# Altium footprint library PrISUm-ICs.PcbLib: 40 footprints (part 3 of 3)
Each footprint in its own frame and in the unit in brackets; x right, y up, seen from the top. Pads: shape width x height; smd on the part's side, far side on the other; paste and mask are expansions set on the pad; w line width, h text height; cw(c..) or ccw(c..) is an arc to the next point about the centre after c.
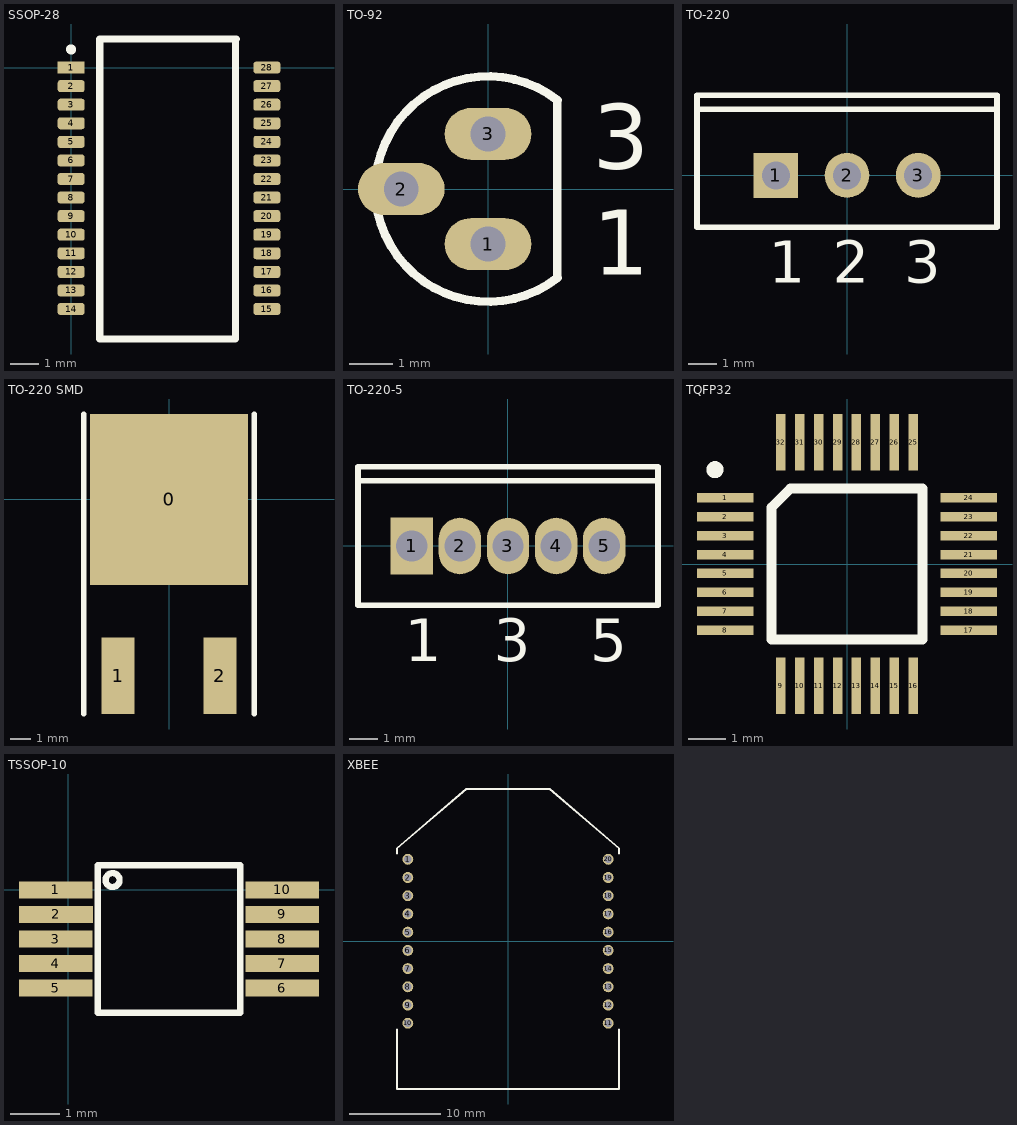
[diagram p2: the footprints below, top view; thin cyan lines are the x and y axes]

## SSOP-28 [mm]
pads (28):
  rect 0.95x0.42 smd: 1(0,0)
  rrect50% 0.95x0.42 smd: 2(0,-0.65) 3(0,-1.3) 4(0,-1.95) 5(0,-2.6) 6(0,-3.25) 7(0,-3.9) 8(0,-4.55) 9(0,-5.2) 10(0,-5.85) 11(0,-6.5) 12(0,-7.15) 13(0,-7.8) 14(0,-8.45) 15(6.85,-8.45) 16(6.85,-7.8) 17(6.85,-7.15) 18(6.85,-6.5) 19(6.85,-5.85) 20(6.85,-5.2) 21(6.85,-4.55) 22(6.85,-3.9) 23(6.85,-3.25) 24(6.85,-2.6) 25(6.85,-1.95) 26(6.85,-1.3) 27(6.85,-0.65) 28(6.85,0)
Top Overlay:
  circle w0.254: c0,0.635 r0.051
  lines w0.254: 5.75,0.975 5.75,0.75 5.75,-9.5 1,-9.5 1,0.75 1,1 5.775,1
3D body "ssop28.stp": height 1.9, standoff 0, extent -0.471,-9.322 7.329,0.878

## TO-92 [mm]
pads (3):
  oval 2x1.2 hole 0.8: 1(0,-1.27) 2(-2,0) 3(0,1.27)
Top Overlay:
  lines w0.2: 1.601,-2.049 cw(c0,0) 1.601,2.049 ; 1.6,-1.99 1.6,1.99
  text "3" at 2.421,0.467 h1.5
  text "1" at 2.421,-1.979 h1.5

## TO-220 [mm]
pads (3):
  rect 1.6x1.6 hole 1: 1(-2.54,0)
  round 1.6 hole 1: 2(0,0) 3(2.54,0)
Top Overlay:
  lines w0.2: -5.35,2.35 5.35,2.35 ; -5.35,-1.85 -5.35,2.85 5.35,2.85 5.35,-1.85 -5.35,-1.85
  text "3" at 2.04,-3.825 h1.5
  text "1" at -2.79,-3.825 h1.5
  text "2" at -0.5,-3.825 h1.5

## TO-220 SMD [mm]
pads (3):
  rect 7.87x8.51 smd: 0(0,0)
  rect 1.65x3.81 smd: 1(-2.54,-8.79) 2(2.54,-8.79)
Top Overlay:
  lines w0.254: -4.25,-10.69 -4.25,4.26 ; 4.25,-10.69 4.25,4.26

## TO-220-5 [mm]
pads (5):
  rect 1.5x2 hole 1.1: 1(-3.4,0)
  oval 1.5x2 hole 1.1: 2(-1.7,0) 3(0,0) 4(1.7,0) 5(3.4,0)
Top Overlay:
  lines w0.2: -5.3,2.3 5.3,2.3 ; -5.3,-2.1 5.3,-2.1 5.3,2.8 -5.3,2.8 -5.3,-2.1
  text "1" at -3.65,-4.075 h1.5
  text "3" at -0.5,-4.075 h1.5
  text "5" at 2.9,-4.075 h1.5

## TQFP32 [mm]
pads (32):
  rect 1.5x0.25 smd: 1(-3.225,1.75) 2(-3.225,1.25) 3(-3.225,0.75) 4(-3.225,0.25) 5(-3.225,-0.25) 6(-3.225,-0.75) 7(-3.225,-1.25) 8(-3.225,-1.75) 17(3.225,-1.75) 18(3.225,-1.25) 19(3.225,-0.75) 20(3.225,-0.25) 21(3.225,0.25) 22(3.225,0.75) 23(3.225,1.25) 24(3.225,1.75)
  rect 0.25x1.5 smd: 9(-1.75,-3.225) 10(-1.25,-3.225) 11(-0.75,-3.225) 12(-0.25,-3.225) 13(0.25,-3.225) 14(0.75,-3.225) 15(1.25,-3.225) 16(1.75,-3.225) 25(1.75,3.225) 26(1.25,3.225) 27(0.75,3.225) 28(0.25,3.225) 29(-0.25,3.225) 30(-0.75,3.225) 31(-1.25,3.225) 32(-1.75,3.225)
Top Overlay:
  circle w0.254: c-3.5,2.5 r0.1
  lines w0.254: -2,-2 -2,-1.5 -2,1.5 -1.5,2 2,2 2,-2 -2,-2

## TSSOP-10 [mm]
pads (10):
  rect 1.5x0.35 smd: 1(-0.254,0) 2(-0.25,-0.5) 3(-0.254,-1) 4(-0.254,-1.5) 5(-0.254,-2) 6(4.35,-2) 7(4.35,-1.5) 8(4.35,-1) 9(4.35,-0.5) 10(4.35,0)
Top Overlay:
  circle w0.127: c0.9,0.2 r0.141
  lines w0.127: 0.6,-2.5 0.6,0.5 3.5,0.5 3.5,-2.5 0.6,-2.5
Top Paste:
  region: 3.6,-0.175 4.6,-0.175 4.6,0.175 3.6,0.175
  region: 3.6,-0.675 4.6,-0.675 4.6,-0.325 3.6,-0.325
  region: 3.6,-1.175 4.6,-1.175 4.6,-0.825 3.6,-0.825
  region: 3.6,-1.675 4.6,-1.675 4.6,-1.325 3.6,-1.325
  region: 3.6,-2.175 4.6,-2.175 4.6,-1.825 3.6,-1.825
  region: -0.5,-2.175 0.5,-2.175 0.5,-1.825 -0.5,-1.825
  region: -0.5,-1.675 0.5,-1.675 0.5,-1.325 -0.5,-1.325
  region: -0.5,-1.175 0.5,-1.175 0.5,-0.825 -0.5,-0.825
  region: -0.5,-0.675 0.5,-0.675 0.5,-0.325 -0.5,-0.325
  region: -0.5,-0.175 0.5,-0.175 0.5,0.175 -0.5,0.175

## XBEE [mm]
pads (20):
  round 1.2 hole 0.8 mask+0.064: 1(-11,9) 2(-11,7) 3(-11,5) 4(-11,3) 5(-11,1) 6(-11,-1) 7(-11,-3) 8(-11,-5) 9(-11,-7) 10(-11,-9) 11(11,-9) 12(11,-7) 13(11,-5) 14(11,-3) 15(11,-1) 16(11,1) 17(11,3) 18(11,5) 19(11,7) 20(11,9)
Top Overlay:
  lines w0.2: -12.19,-9.65 -12.19,-16.22 12.19,-16.22 12.19,-9.65 ; -12.19,9.65 -12.19,10.19 -4.6,16.72 4.6,16.72 12.19,10.19 12.19,9.65
3D body "XBee Pro.stp": height 3.72, standoff -4.06, extent -12.2,-16.225 12.18,16.715